# Altium footprint library 691 310 340 0xx.PcbLib: 23 footprints (part 2 of 2)
Each footprint in its own frame and in the unit in brackets; x right, y up, seen from the top. Pads: shape width x height; smd on the part's side, far side on the other; paste and mask are expansions set on the pad; w line width, h text height; cw(c..) or ccw(c..) is an arc to the next point about the centre after c.
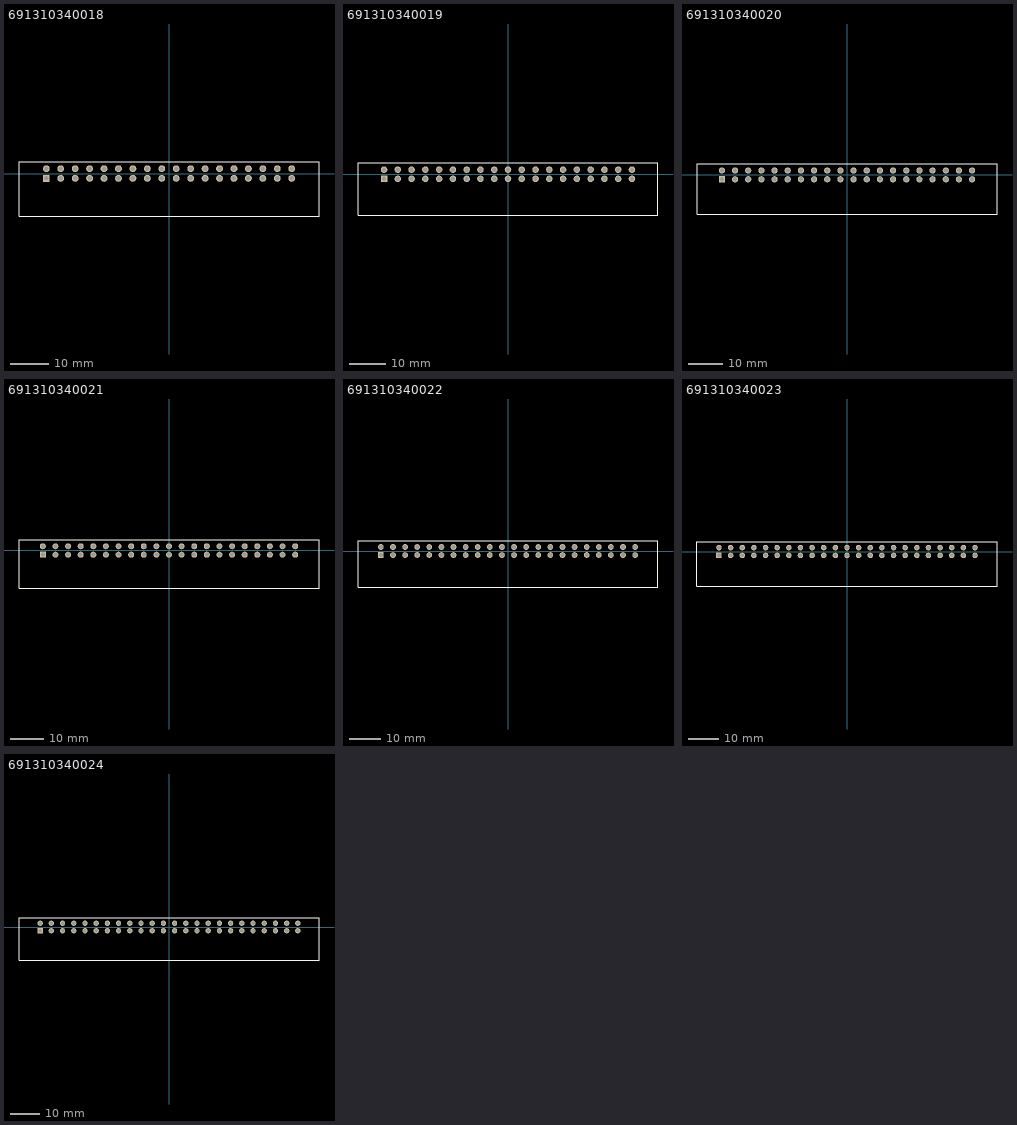
[diagram p1: the footprints below, top view; thin cyan lines are the x and y axes]

## 691310340018 [mm] "Serie 3103 - 3.81 mm _ 18 pins"
height 6.8
pads (36):
  rect 1.8x1.8 hole 1.2: 1(-32.385,-1.27)
  round 1.8 hole 1.2: 1(-32.385,1.27) 2(-28.575,-1.27) 2(-28.575,1.27) 3(-24.765,-1.27) 3(-24.765,1.27) 4(-20.955,-1.27) 4(-20.955,1.27) 5(-17.145,-1.27) 5(-17.145,1.27) 6(-13.335,-1.27) 6(-13.335,1.27) 7(-9.525,-1.27) 7(-9.525,1.27) 8(-5.715,-1.27) 8(-5.715,1.27) 9(-1.905,-1.27) 9(-1.905,1.27) 10(1.905,-1.27) 10(1.905,1.27) 11(5.715,-1.27) 11(5.715,1.27) 12(9.525,-1.27) 12(9.525,1.27) 13(13.335,-1.27) 13(13.335,1.27) 14(17.145,-1.27) 14(17.145,1.27) 15(20.955,-1.27) 15(20.955,1.27) 16(24.765,-1.27) 16(24.765,1.27) 17(28.575,-1.27) 17(28.575,1.27) 18(32.385,-1.27) 18(32.385,1.27)
Top Overlay:
  lines w0.127: -39.589,-11.33 -39.585,3.17 39.585,3.17 39.585,-11.33 -39.585,-11.33
3D body: height 6.9, standoff -3.3, extent -39.55,-11.35 39.62,3.15

## 691310340019 [mm] "Serie 3103 - 3.81 mm _ 19 pins"
height 6.8
pads (38):
  rect 1.8x1.8 hole 1.2: 1(-34.29,-1.27)
  round 1.8 hole 1.2: 1(-34.29,1.27) 2(-30.48,-1.27) 2(-30.48,1.27) 3(-26.67,-1.27) 3(-26.67,1.27) 4(-22.86,-1.27) 4(-22.86,1.27) 5(-19.05,-1.27) 5(-19.05,1.27) 6(-15.24,-1.27) 6(-15.24,1.27) 7(-11.43,-1.27) 7(-11.43,1.27) 8(-7.62,-1.27) 8(-7.62,1.27) 9(-3.81,-1.27) 9(-3.81,1.27) 10(0,-1.27) 10(0,1.27) 11(3.81,-1.27) 11(3.81,1.27) 12(7.62,-1.27) 12(7.62,1.27) 13(11.43,-1.27) 13(11.43,1.27) 14(15.24,-1.27) 14(15.24,1.27) 15(19.05,-1.27) 15(19.05,1.27) 16(22.86,-1.27) 16(22.86,1.27) 17(26.67,-1.27) 17(26.67,1.27) 18(30.48,-1.27) 18(30.48,1.27) 19(34.29,-1.27) 19(34.29,1.27)
Top Overlay:
  lines w0.127: -41.49,-11.33 41.49,-11.33 41.49,3.17 -41.49,3.17 -41.49,-11.33
3D body: height 6.9, standoff -3.3, extent -41.5,-11.3 41.48,3.2

## 691310340020 [mm] "Serie 3103 - 3.81 mm _ 20 pins"
height 6.8
pads (40):
  rect 1.8x1.8 hole 1.2: 1(-36.195,-1.27)
  round 1.8 hole 1.2: 1(-36.195,1.27) 2(-32.385,-1.27) 2(-32.385,1.27) 3(-28.575,-1.27) 3(-28.575,1.27) 4(-24.765,-1.27) 4(-24.765,1.27) 5(-20.955,-1.27) 5(-20.955,1.27) 6(-17.145,-1.27) 6(-17.145,1.27) 7(-13.335,-1.27) 7(-13.335,1.27) 8(-9.525,-1.27) 8(-9.525,1.27) 9(-5.715,-1.27) 9(-5.715,1.27) 10(-1.905,-1.27) 10(-1.905,1.27) 11(1.905,-1.27) 11(1.905,1.27) 12(5.715,-1.27) 12(5.715,1.27) 13(9.525,-1.27) 13(9.525,1.27) 14(13.335,-1.27) 14(13.335,1.27) 15(17.145,-1.27) 15(17.145,1.27) 16(20.955,-1.27) 16(20.955,1.27) 17(24.765,-1.27) 17(24.765,1.27) 18(28.575,-1.27) 18(28.575,1.27) 19(32.385,-1.27) 19(32.385,1.27) 20(36.195,-1.27) 20(36.195,1.27)
Top Overlay:
  lines w0.127: -43.395,-11.33 43.395,-11.33 43.395,3.17 -43.395,3.17 -43.395,-11.33
3D body: height 6.9, standoff -3.3, extent -43.39,-11.3 43.4,3.2

## 691310340021 [mm] "Serie 3103 - 3.81 mm _ 21 pins"
height 6.8
pads (42):
  rect 1.8x1.8 hole 1.2: 1(-38.1,-1.27)
  round 1.8 hole 1.2: 1(-38.1,1.27) 2(-34.29,-1.27) 2(-34.29,1.27) 3(-30.48,-1.27) 3(-30.48,1.27) 4(-26.67,-1.27) 4(-26.67,1.27) 5(-22.86,-1.27) 5(-22.86,1.27) 6(-19.05,-1.27) 6(-19.05,1.27) 7(-15.24,-1.27) 7(-15.24,1.27) 8(-11.43,-1.27) 8(-11.43,1.27) 9(-7.62,-1.27) 9(-7.62,1.27) 10(-3.81,-1.27) 10(-3.81,1.27) 11(0,-1.27) 11(0,1.27) 12(3.81,-1.27) 12(3.81,1.27) 13(7.62,-1.27) 13(7.62,1.27) 14(11.43,-1.27) 14(11.43,1.27) 15(15.24,-1.27) 15(15.24,1.27) 16(19.05,-1.27) 16(19.05,1.27) 17(22.86,-1.27) 17(22.86,1.27) 18(26.67,-1.27) 18(26.67,1.27) 19(30.48,-1.27) 19(30.48,1.27) 20(34.29,-1.27) 20(34.29,1.27) 21(38.1,-1.27) 21(38.1,1.27)
Top Overlay:
  lines w0.127: -45.3,-11.33 45.3,-11.33 45.3,3.17 -45.3,3.17 -45.3,-11.33
3D body: height 6.9, standoff -3.3, extent -45.3,-11.35 45.3,3.15

## 691310340022 [mm] "Serie 3103 - 3.81 mm _ 22 pins"
height 6.8
pads (44):
  rect 1.8x1.8 hole 1.2: 1(-40.005,-1.27)
  round 1.8 hole 1.2: 1(-40.005,1.27) 2(-36.195,-1.27) 2(-36.195,1.27) 3(-32.385,-1.27) 3(-32.385,1.27) 4(-28.575,-1.27) 4(-28.575,1.27) 5(-24.765,-1.27) 5(-24.765,1.27) 6(-20.955,-1.27) 6(-20.955,1.27) 7(-17.145,-1.27) 7(-17.145,1.27) 8(-13.335,-1.27) 8(-13.335,1.27) 9(-9.525,-1.27) 9(-9.525,1.27) 10(-5.715,-1.27) 10(-5.715,1.27) 11(-1.905,-1.27) 11(-1.905,1.27) 12(1.905,-1.27) 12(1.905,1.27) 13(5.715,-1.27) 13(5.715,1.27) 14(9.525,-1.27) 14(9.525,1.27) 15(13.335,-1.27) 15(13.335,1.27) 16(17.145,-1.27) 16(17.145,1.27) 17(20.955,-1.27) 17(20.955,1.27) 18(24.765,-1.27) 18(24.765,1.27) 19(28.575,-1.27) 19(28.575,1.27) 20(32.385,-1.27) 20(32.385,1.27) 21(36.195,-1.27) 21(36.195,1.27) 22(40.005,-1.27) 22(40.005,1.27)
Top Overlay:
  lines w0.127: -47.205,-11.33 47.205,-11.33 47.205,3.17 -47.205,3.17 -47.205,-11.33
3D body: height 6.9, standoff -3.3, extent -47.2,-11.3 47.21,3.2

## 691310340023 [mm] "Serie 3103 - 3.81 mm _ 23 pins"
height 6.8
pads (46):
  rect 1.8x1.8 hole 1.2: 1(-41.91,-1.27)
  round 1.8 hole 1.2: 1(-41.91,1.27) 2(-38.1,-1.27) 2(-38.1,1.27) 3(-34.29,-1.27) 3(-34.29,1.27) 4(-30.48,-1.27) 4(-30.48,1.27) 5(-26.67,-1.27) 5(-26.67,1.27) 6(-22.86,-1.27) 6(-22.86,1.27) 7(-19.05,-1.27) 7(-19.05,1.27) 8(-15.24,-1.27) 8(-15.24,1.27) 9(-11.43,-1.27) 9(-11.43,1.27) 10(-7.62,-1.27) 10(-7.62,1.27) 11(-3.81,-1.27) 11(-3.81,1.27) 12(0,-1.27) 12(0,1.27) 13(3.81,-1.27) 13(3.81,1.27) 14(7.62,-1.27) 14(7.62,1.27) 15(11.43,-1.27) 15(11.43,1.27) 16(15.24,-1.27) 16(15.24,1.27) 17(19.05,-1.27) 17(19.05,1.27) 18(22.86,-1.27) 18(22.86,1.27) 19(26.67,-1.27) 19(26.67,1.27) 20(30.48,-1.27) 20(30.48,1.27) 21(34.29,-1.27) 21(34.29,1.27) 22(38.1,-1.27) 22(38.1,1.27) 23(41.91,-1.27) 23(41.91,1.27)
Top Overlay:
  lines w0.127: -49.11,-11.33 49.11,-11.33 49.11,3.17 -49.11,3.17 -49.11,-11.33
3D body: height 6.9, standoff -3.3, extent -49.1,-11.35 49.12,3.15

## 691310340024 [mm] "Serie 3103 - 3.81 mm _ 24 pins"
height 6.8
pads (48):
  rect 1.8x1.8 hole 1.2: 1(-43.815,-1.27)
  round 1.8 hole 1.2: 1(-43.815,1.27) 2(-40.005,-1.27) 2(-40.005,1.27) 3(-36.195,-1.27) 3(-36.195,1.27) 4(-32.385,-1.27) 4(-32.385,1.27) 5(-28.575,-1.27) 5(-28.575,1.27) 6(-24.765,-1.27) 6(-24.765,1.27) 7(-20.955,-1.27) 7(-20.955,1.27) 8(-17.145,-1.27) 8(-17.145,1.27) 9(-13.335,-1.27) 9(-13.335,1.27) 10(-9.525,-1.27) 10(-9.525,1.27) 11(-5.715,-1.27) 11(-5.715,1.27) 12(-1.905,-1.27) 12(-1.905,1.27) 13(1.905,-1.27) 13(1.905,1.27) 14(5.715,-1.27) 14(5.715,1.27) 15(9.525,-1.27) 15(9.525,1.27) 16(13.335,-1.27) 16(13.335,1.27) 17(17.145,-1.27) 17(17.145,1.27) 18(20.955,-1.27) 18(20.955,1.27) 19(24.765,-1.27) 19(24.765,1.27) 20(28.575,-1.27) 20(28.575,1.27) 21(32.385,-1.27) 21(32.385,1.27) 22(36.195,-1.27) 22(36.195,1.27) 23(40.005,-1.27) 23(40.005,1.27) 24(43.815,-1.27) 24(43.815,1.27)
Top Overlay:
  lines w0.127: -51.015,-11.33 51.015,-11.33 51.015,3.17 -51.015,3.17 -51.015,-11.33
3D body: height 6.9, standoff -3.3, extent -51,-11.3 51.03,3.2